# Altium footprint library General.PCBLIB: 231 footprints (part 15 of 15)
Each footprint in its own frame and in the unit in brackets; x right, y up, seen from the top. Pads: shape width x height; smd on the part's side, far side on the other; paste and mask are expansions set on the pad; w line width, h text height; cw(c..) or ccw(c..) is an arc to the next point about the centre after c.
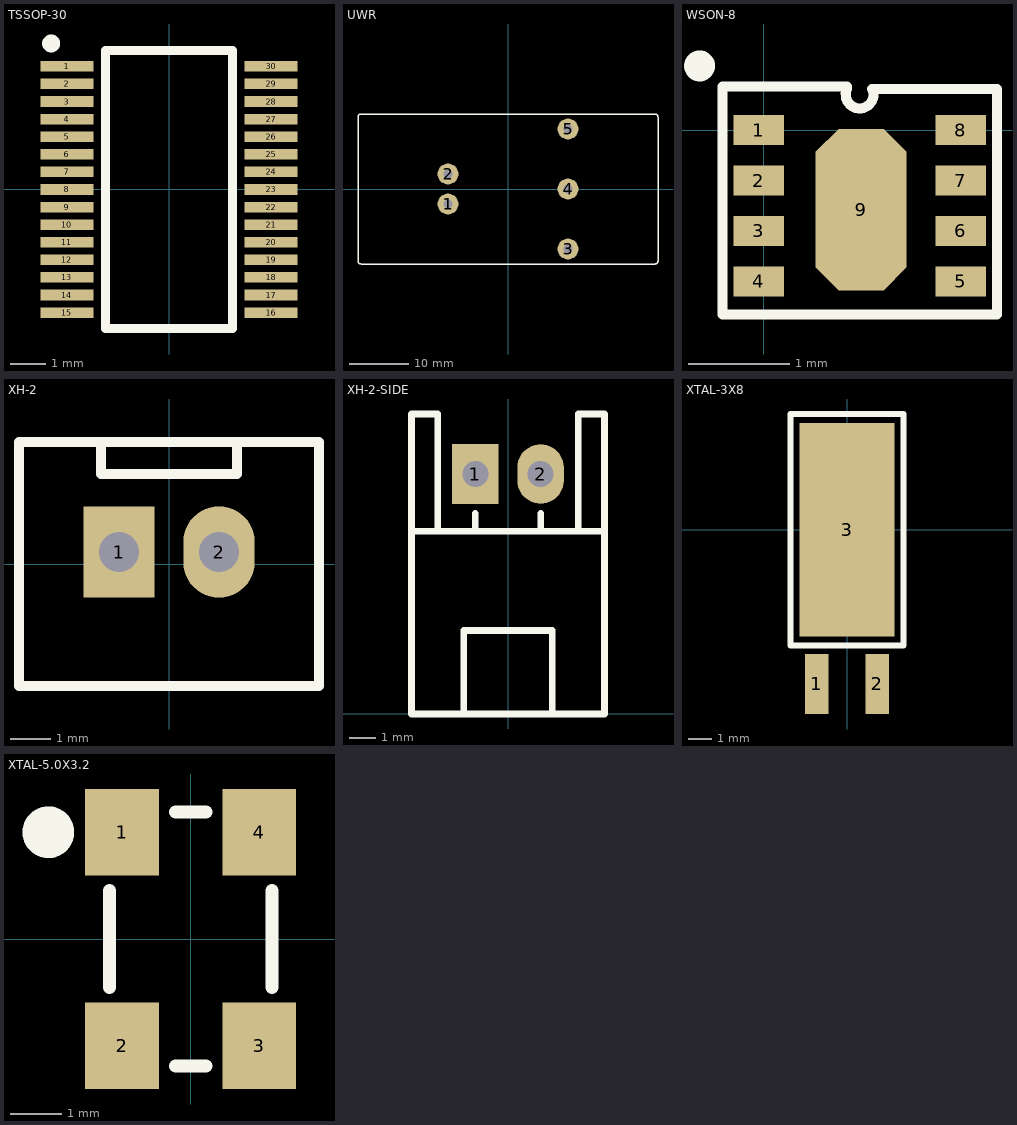
[diagram p14: the footprints below, top view; thin cyan lines are the x and y axes]

## TSSOP-30 [mm] "TSSOP, 30PIN"
height 1.2
pads (30):
  rect 1.5x0.3 smd: 1(-2.9,3.5) 2(-2.9,3) 3(-2.9,2.5) 4(-2.9,2) 5(-2.9,1.5) 6(-2.9,1) 7(-2.9,0.5) 8(-2.9,0) 9(-2.9,-0.5) 10(-2.9,-1) 11(-2.9,-1.5) 12(-2.9,-2) 13(-2.9,-2.5) 14(-2.9,-3) 15(-2.9,-3.5) 16(2.9,-3.5) 17(2.9,-3) 18(2.9,-2.5) 19(2.9,-2) 20(2.9,-1.5) 21(2.9,-1) 22(2.9,-0.5) 23(2.9,0) 24(2.9,0.5) 25(2.9,1) 26(2.9,1.5) 27(2.9,2) 28(2.9,2.5) 29(2.9,3) 30(2.9,3.5)
Top Overlay:
  circle w0.254: c-3.35,4.15 r0.127
  lines w0.254: -1.8,-3.95 -1.8,3.95 1.8,3.95 1.8,-3.95 -1.8,-3.95
3D body "SOP50P640X120-30N_MO-153BC-1_DBT.step": height 1.35, standoff 0, extent -3.228,-3.95 3.228,3.95

## UWR [mil] "MURATA POWER"
height 375
pads (5):
  round 140 hole 62.99: 1(-400,-100) 2(-400,100) 3(400,-400) 4(400,0) 5(400,400)
Top Overlay:
  lines w10: -1000,-480 ccw(c-980,-480) -980,-500 980,-500 ccw(c980,-480) 1000,-480 1000,480 ccw(c980,480) 980,500 -980,500 ccw(c-980,480) -1000,480 -1000,-480
3D body: height 375, standoff 0, extent -1000,-500 1000,500

## WSON-8 [mm]
pads (9):
  rect 0.5x0.3 smd: 1(-0.05,0) 2(-0.05,-0.5) 3(-0.05,-1) 4(-0.05,-1.5) 5(1.95,-1.5) 6(1.95,-1) 7(1.95,-0.5) 8(1.95,0)
  oct 0.9x1.6 smd: 9(0.965,-0.787)
Top Overlay:
  circle w0.254: c-0.635,0.635 r0.025
  lines w0.1: 0.825,0.406 ccw(c0.95,0.35) 1.075,0.406 2.311,0.406 2.311,-1.829 -0.406,-1.829 -0.406,0.432 0.825,0.432

## XH-2 [mm] "Pin Header"
height 7
pads (2):
  rect 1.778x2.286 hole 1: 1(-1.25,0.3)
  oval 1.778x2.286 hole 1: 2(1.25,0.3)
Top Overlay:
  lines w0.254: -1.7,3.05 -1.7,2.25 1.7,2.25 1.7,3.05 ; -3.75,-3.05 -3.75,3.05 3.75,3.05 3.75,-3.05 -3.75,-3.05
3D body "XH-2.STEP": height 7, standoff -3.4, extent -3.7,-3.05 3.7,3.05

## XH-2-SIDE [mm] "Pin Header, Side entry"
height 6.1
pads (2):
  rect 1.778x2.286 hole 1: 1(-1.25,9.2)
  oval 1.778x2.286 hole 1: 2(1.25,9.2)
Top Overlay:
  lines w0.254: -3.7,7 3.7,7 ; -2.7,7 -2.7,11.5 -3.7,11.5 -3.7,0 3.7,0 3.7,11.5 2.7,11.5 2.7,7 ; -1.7,0 -1.7,3.2 1.7,3.2 1.7,0 ; -1.25,7 -1.25,7.7 ; 1.25,7 1.25,7.7
3D body "S2B-XH-A.STEP": height 5.95, standoff -3.4, extent -3.7,0 3.7,11.5

## XTAL-3X8 [mm] "Crystal"
height 3
pads (3):
  rect 1x2.54 smd: 1(-1.27,-6.5) 2(1.27,-6.5)
  rect 4x9 smd: 3(0,0)
Top Overlay:
  lines w0.254: -2.38,-4.88 -2.38,4.88 2.38,4.88 2.38,-4.88 -2.38,-4.88
3D body "XTAL-3X8.STEP": height 2.24, standoff -0.01, extent -1.395,-7.5 1.395,2

## XTAL-5.0X3.2 [mm] "Oscillator"
height 1.5
pads (4):
  rect 1.45x1.7 smd: 1(-1.35,2.1) 2(-1.35,-2.1) 3(1.35,-2.1) 4(1.35,2.1)
Top Overlay:
  circle w0.508: c-2.8,2.1 r0.254
  lines w0.254: -1.6,-0.95 -1.6,0.95 ; -0.3,-2.5 0.3,-2.5 ; -0.3,2.5 0.3,2.5 ; 1.6,-0.95 1.6,0.95
3D body "XTAL-5.0X3.2.STEP": height 1, standoff 0, extent -1.6,-2.5 1.6,2.5